# Altium footprint library Standard.PcbLib: 158 footprints (part 5 of 10)
Each footprint in its own frame and in the unit in brackets; x right, y up, seen from the top. Pads: shape width x height; smd on the part's side, far side on the other; paste and mask are expansions set on the pad; w line width, h text height; cw(c..) or ccw(c..) is an arc to the next point about the centre after c.
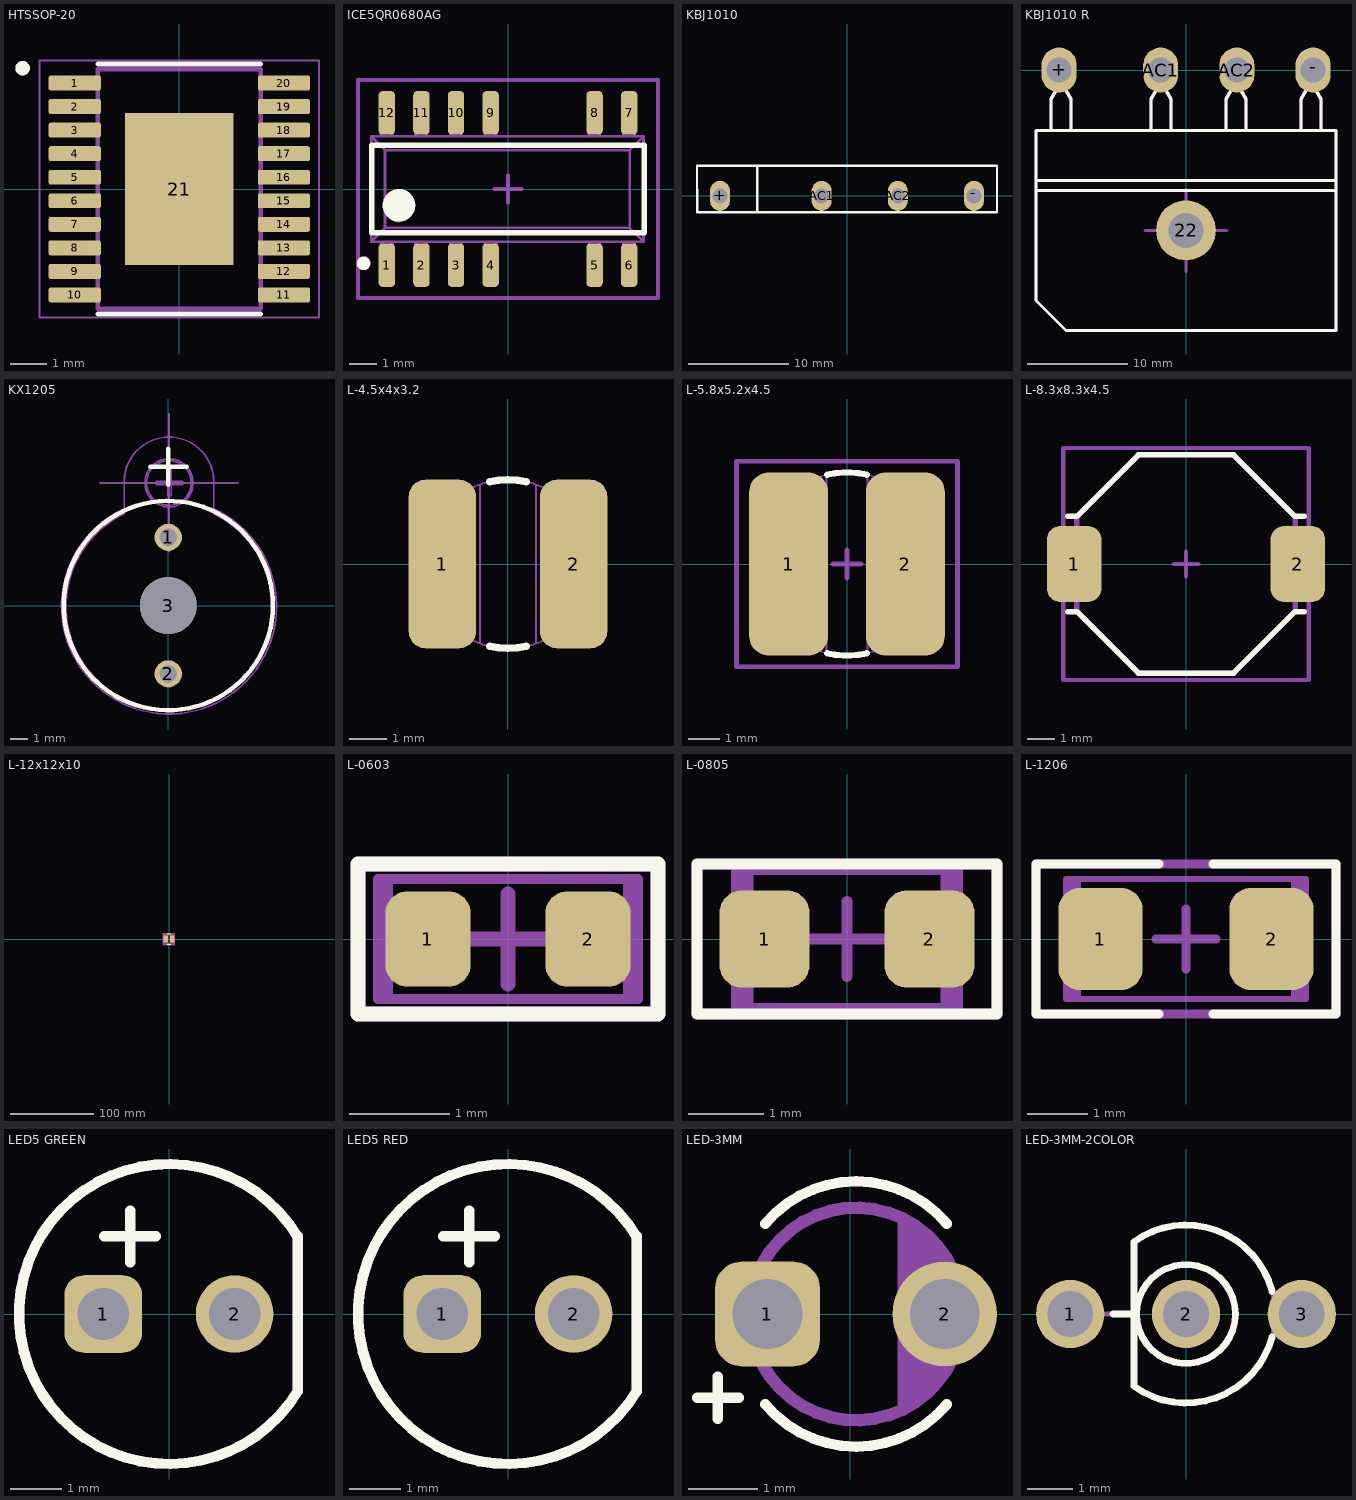
[diagram p4: the footprints below, top view; thin cyan lines are the x and y axes]

## HTSSOP-20 [mm]
pads (21):
  rrect25% 1.44x0.41 smd: 1(-2.885,2.925) 2(-2.885,2.275) 3(-2.885,1.625) 4(-2.885,0.975) 5(-2.885,0.325) 6(-2.885,-0.325) 7(-2.885,-0.975) 8(-2.885,-1.625) 9(-2.885,-2.275) 10(-2.885,-2.925) 11(2.885,-2.925) 12(2.885,-2.275) 13(2.885,-1.625) 14(2.885,-0.975) 15(2.885,-0.325) 16(2.885,0.325) 17(2.885,0.975) 18(2.885,1.625) 19(2.885,2.275) 20(2.885,2.925)
  rect 3x4.2 smd paste-3: 21(0,0)
Top Overlay:
  circle w0.2: c-4.325,3.335 r0.1
  lines w0.127: -2.25,-3.45 2.25,-3.45 ; -2.25,3.45 2.25,3.45
Top Paste:
  region: 0.75,-1.05 -0.75,-1.05 -0.75,1.05 0.75,1.05
Top Assembly:
  circle w0.2: c-4.325,3.335 r0.1
  lines w0.127: -2.25,-3.3 -2.25,3.3 2.25,3.3 2.25,-3.3 -2.25,-3.3
Top Component Outline:
  lines w0.05: -3.855,-3.55 -3.855,3.55 3.855,3.55 3.855,-3.55 -3.855,-3.55
3D body "LM5116MHX.STEP": height 1.1, standoff 0, extent -3.2,-3.25 3.2,3.25

## ICE5QR0680AG [mm] "SOIC, 12-Leads, ICE5QR0680AG"
height 1.75
pads (12):
  rrect50% 0.6x1.6 smd: 1(-4.458,-2.794) 2(-3.188,-2.794) 3(-1.918,-2.794) 4(-0.648,-2.794) 5(3.162,-2.794) 6(4.432,-2.794) 7(4.432,2.794) 8(3.162,2.794) 9(-0.648,2.794) 10(-1.918,2.794) 11(-3.188,2.794) 12(-4.458,2.794)
Top Overlay:
  circle w0.25: c-5.308,-2.725 r0.125
  circle w0.6: c-4.013,-0.6 r0.3
  lines w0.2: -5.013,-1.6 4.987,-1.6 4.987,1.6 -5.013,1.6 -5.013,-1.6
Top Assembly:
  drawing of 212 lines, arcs and shapes, not listed
Top Component Outline:
  lines w0.15: -0.513,0 0.487,0 ; -0.013,-0.5 -0.013,0.5 ; -5.513,-4 5.487,-4 5.487,4 -5.513,4 -5.513,-4
3D body "ICE5QR0680AG.STEP": height 1.7, standoff -0.05, extent -5.013,-2.9 4.987,2.9

## KBJ1010 [mm]
pads (4):
  oval 2x3 hole 1.5: +(-12.7,0) -(12.7,0) AC1(-2.54,0) AC2(5.08,0)
Top Overlay:
  lines w0.2: -9,-1.625 -9,3 ; -15,-1.625 15,-1.625 15,3 -15,3 -15,-1.625
  lines w0.25: -9,-1.625 -9,3 ; -15,-1.625 15,-1.625 15,3 -15,3 -15,-1.625
3D body "User Library-Silicon Bridge Rectifiers KBJ1010.step": height 23.85, standoff -13.35, extent -15,-1.8 15,3

## KBJ1010 R [mm]
pads (5):
  round 6 hole 3.5: 22(-0.009,-16.043)
  oval 3.5x4.5 hole 2.5: +(-12.7,0) -(12.7,0) AC1(-2.54,0) AC2(5.08,0)
Top Overlay:
  lines w0.3: -13.509,-6.043 -13.509,-2.909 -13.009,-2.043 -13.009,-0.343 ; -11.509,-6.043 -11.509,-2.909 -12.009,-2.043 -12.009,-0.343 ; -3.509,-6.043 -3.509,-2.909 -3.009,-2.043 -3.009,-0.343 ; -1.509,-6.043 -1.509,-2.909 -2.009,-2.043 -2.009,-0.343 ; 3.991,-6.043 3.991,-2.909 4.491,-2.043 4.491,-0.343 ; 5.991,-6.043 5.991,-2.909 5.491,-2.043 5.491,-0.343 ; 11.491,-6.043 11.491,-2.909 11.991,-2.043 11.991,-0.343 ; 13.491,-6.043 13.491,-2.909 12.991,-2.043 12.991,-0.343 ; -15.009,-12.043 14.991,-12.043 ; -15.009,-12.043 -15.009,-11.043 ; -15.009,-12.043 -15.009,-23.043 -12.009,-26.043 14.991,-26.043 14.991,-12.043 ; -15.009,-11.043 -15.009,-6.043 14.991,-6.043 14.991,-11.043 ; -15.009,-11.043 14.991,-11.043 ; -13.009,-0.343 -13.009,0.007 ; -13.009,-0.343 -12.009,-0.343 ; -13.009,0.007 -13.009,0.707 -12.609,0.707 ; -13.009,0.007 -12.609,0.007 ; -12.609,0.007 -12.609,0.707 ; -12.609,0.007 -12.409,0.007 ; -12.609,0.707 -12.409,0.707 ; -12.409,0.007 -12.409,0.707 ; -12.409,0.007 -12.009,0.007 ; -12.409,0.707 -12.009,0.707 -12.009,0.007 ; -12.009,-0.343 -12.009,0.007 ; -3.009,-0.343 -3.009,0.007 ; -3.009,-0.343 -2.009,-0.343 ; -3.009,0.007 -3.009,0.707 -2.609,0.707 ; -3.009,0.007 -2.609,0.007 ; -2.609,0.007 -2.609,0.707 ; -2.609,0.007 -2.409,0.007 ; -2.609,0.707 -2.409,0.707 ; -2.409,0.007 -2.409,0.707 ; -2.409,0.007 -2.009,0.007 ; -2.409,0.707 -2.009,0.707 -2.009,0.007 ; -2.009,-0.343 -2.009,0.007 ; 4.491,-0.343 4.491,0.007 ; 4.491,-0.343 5.491,-0.343 ; 4.491,0.007 4.491,0.707 4.891,0.707 ; 4.491,0.007 4.891,0.007 ; 4.891,0.007 4.891,0.707 ; 4.891,0.007 5.091,0.007 ; 4.891,0.707 5.091,0.707 ; 5.091,0.007 5.091,0.707 ; 5.091,0.007 5.491,0.007 ; 5.091,0.707 5.491,0.707 5.491,0.007 ; 5.491,-0.343 5.491,0.007 ; 11.991,-0.343 11.991,0.007 ; 11.991,-0.343 12.991,-0.343 ; 11.991,0.007 11.991,0.707 12.391,0.707 ; 11.991,0.007 12.391,0.007 ; 12.391,0.007 12.391,0.707 ; 12.391,0.007 12.591,0.007 ; 12.391,0.707 12.591,0.707 ; 12.591,0.007 12.591,0.707 ; 12.591,0.007 12.991,0.007 ; 12.591,0.707 12.991,0.707 12.991,0.007 ; 12.991,-0.343 12.991,0.007 ; 14.991,-12.043 14.991,-11.043
Top Assembly:
  circle w0.3: c-0.009,-16.043 r1.6
  lines w0.3: -13.509,-6.043 -13.509,-2.909 -13.009,-2.043 -13.009,-0.343 ; -11.509,-6.043 -11.509,-2.909 -12.009,-2.043 -12.009,-0.343 ; -4.109,-16.043 -2.509,-16.043 -0.009,-16.043 ; -3.509,-6.043 -3.509,-2.909 -3.009,-2.043 -3.009,-0.343 ; -1.509,-6.043 -1.509,-2.909 -2.009,-2.043 -2.009,-0.343 ; -0.009,-20.143 -0.009,-18.543 -0.009,-16.043 ; -0.009,-11.943 -0.009,-13.543 -0.009,-16.043 ; 3.991,-6.043 3.991,-2.909 4.491,-2.043 4.491,-0.343 ; 4.091,-16.043 2.491,-16.043 -0.009,-16.043 ; 5.991,-6.043 5.991,-2.909 5.491,-2.043 5.491,-0.343 ; 11.491,-6.043 11.491,-2.909 11.991,-2.043 11.991,-0.343 ; 13.491,-6.043 13.491,-2.909 12.991,-2.043 12.991,-0.343 ; -15.009,-12.043 -15.009,-23.043 -12.009,-26.043 14.991,-26.043 14.991,-12.043 ; -15.009,-12.043 -15.009,-11.043 ; -15.009,-12.043 14.991,-12.043 ; -15.009,-11.043 14.991,-11.043 ; -15.009,-11.043 -15.009,-6.043 14.991,-6.043 14.991,-11.043 ; -13.009,-0.343 -12.009,-0.343 ; -13.009,-0.343 -13.009,0.007 ; -13.009,0.007 -12.609,0.007 ; -13.009,0.007 -13.009,0.707 -12.609,0.707 ; -12.609,0.007 -12.409,0.007 ; -12.609,0.007 -12.609,0.707 ; -12.609,0.707 -12.409,0.707 ; -12.409,0.007 -12.009,0.007 ; -12.409,0.007 -12.409,0.707 ; -12.409,0.707 -12.009,0.707 -12.009,0.007 ; -12.009,-0.343 -12.009,0.007 ; -3.009,-0.343 -2.009,-0.343 ; -3.009,-0.343 -3.009,0.007 ; -3.009,0.007 -2.609,0.007 ; -3.009,0.007 -3.009,0.707 -2.609,0.707 ; -2.609,0.007 -2.409,0.007 ; -2.609,0.007 -2.609,0.707 ; -2.609,0.707 -2.409,0.707 ; -2.409,0.007 -2.009,0.007 ; -2.409,0.007 -2.409,0.707 ; -2.409,0.707 -2.009,0.707 -2.009,0.007 ; -2.009,-0.343 -2.009,0.007 ; 4.491,-0.343 5.491,-0.343 ; 4.491,-0.343 4.491,0.007 ; 4.491,0.007 4.891,0.007 ; 4.491,0.007 4.491,0.707 4.891,0.707 ; 4.891,0.007 5.091,0.007 ; 4.891,0.007 4.891,0.707 ; 4.891,0.707 5.091,0.707 ; 5.091,0.007 5.491,0.007 ; 5.091,0.007 5.091,0.707 ; 5.091,0.707 5.491,0.707 5.491,0.007 ; 5.491,-0.343 5.491,0.007 ; 11.991,-0.343 12.991,-0.343 ; 11.991,-0.343 11.991,0.007 ; 11.991,0.007 12.391,0.007 ; 11.991,0.007 11.991,0.707 12.391,0.707 ; 12.391,0.007 12.591,0.007 ; 12.391,0.007 12.391,0.707 ; 12.391,0.707 12.591,0.707 ; 12.591,0.007 12.991,0.007 ; 12.591,0.007 12.591,0.707 ; 12.591,0.707 12.991,0.707 12.991,0.007 ; 12.991,-0.343 12.991,0.007 ; 14.991,-12.043 14.991,-11.043
3D body "User Library-bridge-15A-V.step": height 10, standoff -4.15, extent -15,-26.5 15,0.25

## KX1205 [mil]
pads (3):
  round 60 hole 38: 1(0,150) 2(0,-150)
  round 125 hole 125 unplated: 3(0,0)
Top Overlay:
  circle w10: c0,0 r230
  lines w10: -40,305 40,305 ; 0,265 0,345
Top Assembly:
  circle w3.94: c1.57,269.56 r52.93
  circle w3.94: c1.57,269.56 r48.99
  lines w3.94: -149.78,269.56 -96.85,269.56 1.57,269.56 ; -96.85,212.77 ccw(c1.57,-1.97) 100,212.77 ; 1.57,118.2 1.57,171.13 1.57,269.56 ; 1.57,420.92 1.57,367.98 1.57,269.56 ; 152.93,269.56 100,269.56 1.57,269.56 ; -96.85,201.89 ccw(c1.57,-1.97) 100,201.89 100,271.82 ccw(c1.57,271.82) -96.85,271.82 -96.85,201.89 ; -25.68,265.78 -25.68,273.26 -1.1,273.26 -1.1,297.84 6.38,297.84 6.38,273.26 30.95,273.26 30.95,265.78 6.38,265.78 6.38,241.21 -1.1,241.21 -1.1,265.78 -25.68,265.78
3D body "ALSRobot-BUZZER.step": height 379.92, standoff -177.17, extent -236.22,-236.22 236.22,372.21

## L-4.5x4x3.2 [mm]
pads (2):
  rrect50% 1.8x4.5 smd: 1(-1.75,0) 2(1.75,0)
Top Overlay:
  lines w0.2: -0.488,-2.196 ccw(c0,0) 0.488,-2.196 ; -0.488,2.196 cw(c0,0) 0.488,2.196
Top Assembly:
  lines w0.05: -2.23,-0.301 ccw(c0,0) 2.229,-0.304 ; -2.229,0.304 cw(c0,0) 2.23,0.301 ; -2.225,-0.3 -1.946,-0.3 ; -2.225,0.3 -1.946,0.3 ; -1.981,-0.3 ccw(c-1.981,0) -1.981,0.3 ; -0.75,-2.108 -0.75,2.125 ; 0.75,-2.108 0.75,2.1 ; 1.946,-0.3 2.225,-0.3 ; 1.946,0.3 2.225,0.3 ; 1.981,-0.3 cw(c1.981,0) 1.981,0.3
3D body "User Library-Inductor SDR0403 Series.STEP": height 3.25, standoff 0, extent -2.201,-2.25 2.201,2.25

## L-5.8x5.2x4.5 [mm] "Дроссель SMD"
height 4.5
pads (2):
  rrect50% 2.5x5.8 smd: 1(-1.85,0) 2(1.85,0)
Top Overlay:
  lines w0.2: -0.629,-2.831 ccw(c0,0) 0.629,-2.831 ; -0.629,2.831 cw(c0,0) 0.629,2.831
Top Assembly:
  lines w0.05: -2.681,-0.3 ccw(c-2.681,0) -2.681,0.3 ; -2.646,-0.3 -2.786,-0.3 -2.874,-0.388 ccw(c0,0) 2.873,-0.392 ; -2.646,0.3 -2.777,0.3 -2.873,0.396 cw(c0,0) 2.874,0.388 2.778,0.291 2.647,0.291 ; -0.65,-2.825 -0.65,2.825 ; 0.65,-2.825 0.65,2.825 ; 2.647,-0.309 2.788,-0.309 2.875,-0.396 ; 2.682,-0.309 cw(c2.682,-0.009) 2.682,0.291
Top Component Outline:
  lines w0.15: -0.45,0 0.45,0 ; 0,-0.45 0,0.45 ; -3.5,-3.25 3.5,-3.25 3.5,3.25 -3.5,3.25 -3.5,-3.25
3D body "SMD_Inductor_CD54.step": height 4.49, standoff -0.01, extent -2.9,-2.6 2.9,2.6

## L-8.3x8.3x4.5 [mm] "Дроссель SMD"
height 4.5
pads (2):
  rrect50% 2x2.8 smd: 1(-4.1,0) 2(4.1,0)
Top Overlay:
  lines w0.2: -4.343,-1.75 -4,-1.75 -1.75,-4 1.75,-4 4,-1.75 4.342,-1.75 ; -4.342,1.75 -4,1.75 -1.75,4 1.75,4 4,1.75 4.343,1.75
Top Assembly:
  lines w0.2: -1.75,4 -4,1.75 -4,-1.75 -1.75,-4 1.75,-4 4,-1.75 4,1.75 1.75,4
Top Component Outline:
  lines w0.15: -0.45,0 0.45,0 ; 0,-0.45 0,0.45 ; -4.5,-4.25 -4.5,4.25 4.5,4.25 4.5,-4.25 -4.5,-4.25
3D body "User Library-drumCoreInductorSMT.STEP": height 4.5, standoff 0, extent -4.342,-4 4.343,4

## L-12x12x10 [mm]
pads (2):
  rect 5x9 smd: 1(-4,0) 2(4,0)
Top Layer:
  region: -6.5,4.6 -6.5,4.758 -6.439,5.067 -6.318,5.358 -6.143,5.62 -5.92,5.843 -5.658,6.018 -5.367,6.139 -5.058,6.2 -4.9,6.2 -2.5,6.2 -2.5,3.874 -6.5,3.874
  region: -6.5,-4.6 -6.5,-4.758 -6.439,-5.067 -6.318,-5.358 -6.143,-5.62 -5.92,-5.843 -5.658,-6.018 -5.367,-6.139 -5.058,-6.2 -4.9,-6.2 -2.5,-6.2 -2.5,-3.874 -6.5,-3.874
  region: 6.5,-4.6 6.5,-4.758 6.439,-5.067 6.318,-5.358 6.143,-5.62 5.92,-5.843 5.658,-6.018 5.367,-6.139 5.058,-6.2 4.9,-6.2 2.5,-6.2 2.5,-3.969 6.5,-3.969
  region: 6.5,4.6 6.5,4.758 6.439,5.067 6.318,5.358 6.143,5.62 5.92,5.843 5.658,6.018 5.367,6.139 5.058,6.2 4.9,6.2 2.5,6.2 2.5,3.874 6.5,3.874
Top Overlay:
  lines w0.2: -2.046,-6.15 -2.046,-6.15 2.046,-6.15 ; -2.046,6.15 2.046,6.15
Top Solder:
  region: -6.6,-4.6 -6.602,-4.762 -6.545,-5.081 -6.428,-5.382 -6.256,-5.656 -6.034,-5.892 -5.771,-6.081 -5.476,-6.216 -5.162,-6.293 -5,-6.3 -2.4,-6.3 -2.4,-4.5 -6.6,-4.5
  region: -6.6,4.6 -6.602,4.762 -6.545,5.081 -6.428,5.382 -6.256,5.656 -6.034,5.892 -5.771,6.081 -5.476,6.216 -5.162,6.293 -5,6.3 -2.4,6.3 -2.4,4.5 -6.6,4.5
  region: 6.6,4.6 6.602,4.762 6.545,5.081 6.428,5.383 6.256,5.656 6.034,5.892 5.771,6.081 5.476,6.216 5.162,6.293 5,6.3 2.4,6.3 2.4,4.5 6.6,4.5
  region: 6.6,-4.6 6.602,-4.762 6.545,-5.081 6.428,-5.383 6.256,-5.656 6.034,-5.892 5.771,-6.081 5.476,-6.216 5.162,-6.293 5,-6.3 2.4,-6.3 2.4,-4.5 6.6,-4.5
Top Assembly:
  circle w0.05: c0,0 r5.25
  circle w0.05: c-2.828,2.828 r0.25
  circle w0.05: c0,0 r5
  lines w0.05: -4.58,-3.045 -4.359,-2.926 ; -4.58,3.045 -4.359,2.926 ; -4.049,-3.342 -4.581,-3.874 ccw(c0,0) -3.874,-4.581 -3.342,-4.049 ; -4.049,3.342 -4.581,3.874 cw(c0,0) -3.874,4.581 -3.342,4.049 ; -3.045,-4.58 -2.926,-4.359 ; -3.045,4.58 -2.926,4.359 ; -2.165,-5.056 -2.046,-4.835 ; -2.165,5.056 -2.046,4.835 ; 2.046,-4.835 2.165,-5.056 ; 2.046,4.835 2.165,5.056 ; 2.926,-4.359 3.045,-4.58 ; 2.926,4.359 3.045,4.58 ; 3.342,-4.049 3.874,-4.581 ccw(c0,0) 4.581,-3.874 4.049,-3.342 ; 3.342,4.049 3.874,4.581 cw(c0,0) 4.581,3.874 4.049,3.342 ; 4.359,-2.926 4.58,-3.045 ; 4.359,2.926 4.58,3.045 ; -6.25,-4.25 ccw(c-4.25,-4.25) -4.25,-6.25 ; -6.25,-4.25 -6.15,-4.25 ; -6.25,-4.25 -6.25,4.25 ; -6.25,4.25 cw(c-4.25,4.25) -4.25,6.25 ; -6.25,4.25 -6.15,4.25 ; -6.15,-4.25 ccw(c-4.25,-4.25) -4.25,-6.15 ; -6.15,-4.25 -6.15,4.25 ; -6.15,4.25 cw(c-4.25,4.25) -4.25,6.15 ; -4.809,-2.966 cw(c0,0) -4.809,2.966 ; -4.809,-2.966 ccw(c-4.25,-4.25) -2.966,-4.809 ; -4.809,-2.966 cw(c-7.071,-5.196) -4.699,-3.083 ; -4.809,-2.966 cw(c11.081,-87.461) -4.65,-2.937 ; -4.809,2.966 ccw(c11.081,87.461) -4.65,2.937 ; -4.809,2.966 ccw(c-7.056,5.182) -4.699,3.083 ; -4.809,2.966 cw(c-4.25,4.25) -2.966,4.809 ; -4.699,-3.083 ccw(c-4.25,-4.25) -3.083,-4.699 ; -4.699,-3.083 ccw(c-4.735,-2.99) -4.65,-2.937 ; -4.699,-3.083 -4.581,-3.044 -4.65,-2.937 ; -4.699,3.083 cw(c-4.735,2.99) -4.65,2.937 ; -4.699,3.083 cw(c-4.25,4.25) -3.083,4.699 ; -4.699,3.083 -4.581,3.044 -4.65,2.937 ; -4.65,-2.937 cw(c0,0) -4.65,2.937 ; -4.25,-6.25 -4.25,-6.15 ; -4.25,-6.25 4.25,-6.25 ; -4.25,-6.15 4.25,-6.15 ; -4.25,6.15 4.25,6.15 ; -4.25,6.15 -4.25,6.25 ; -4.25,6.25 4.25,6.25 ; -3.083,-4.699 cw(c-5.196,-7.071) -2.966,-4.809 ; -3.083,-4.699 cw(c-2.99,-4.735) -2.937,-4.65 ; -3.083,-4.699 -3.044,-4.581 -2.937,-4.65 ; -3.083,4.699 ccw(c-5.182,7.056) -2.966,4.809 ; -3.083,4.699 ccw(c-2.99,4.735) -2.937,4.65 ; -3.083,4.699 -3.044,4.581 -2.937,4.65 ; -2.966,-4.809 ccw(c0,0) 2.966,-4.809 ; -2.966,-4.809 ccw(c-91.284,11.797) -2.937,-4.65 ; -2.966,4.809 cw(c0,0) 2.966,4.809 ; -2.966,4.809 cw(c-87.461,-11.081) -2.937,4.65 ; -2.937,-4.65 ccw(c0,0) 2.937,-4.65 ; -2.937,4.65 cw(c0,0) 2.937,4.65 ; 2.937,-4.65 ccw(c91.284,11.797) 2.966,-4.809 ; 2.937,-4.65 cw(c2.99,-4.735) 3.083,-4.699 ; 2.937,-4.65 3.044,-4.581 3.083,-4.699 ; 2.937,4.65 cw(c87.461,-11.081) 2.966,4.809 ; 2.937,4.65 ccw(c2.99,4.735) 3.083,4.699 ; 2.937,4.65 3.044,4.581 3.083,4.699 ; 2.966,-4.809 cw(c5.196,-7.071) 3.083,-4.699 ; 2.966,-4.809 ccw(c4.25,-4.25) 4.809,-2.966 ; 2.966,4.809 ccw(c5.182,7.056) 3.083,4.699 ; 2.966,4.809 cw(c4.25,4.25) 4.809,2.966 ; 3.083,-4.699 ccw(c4.25,-4.25) 4.699,-3.083 ; 3.083,4.699 cw(c4.25,4.25) 4.699,3.083 ; 4.25,-6.25 ccw(c4.25,-4.25) 6.25,-4.25 ; 4.25,-6.25 4.25,-6.15 ; 4.25,-6.15 ccw(c4.25,-4.25) 6.15,-4.25 ; 4.25,6.15 cw(c4.25,4.25) 6.15,4.25 ; 4.25,6.15 4.25,6.25 ; 4.25,6.25 cw(c4.25,4.25) 6.25,4.25 ; 4.65,-2.937 cw(c-11.797,-91.284) 4.809,-2.966 ; 4.65,-2.937 ccw(c0,0) 4.65,2.937 ; 4.65,-2.937 ccw(c4.735,-2.99) 4.699,-3.083 ; 4.65,-2.937 4.581,-3.044 4.699,-3.083 ; 4.65,2.937 ccw(c-11.797,91.284) 4.809,2.966 ; 4.65,2.937 cw(c4.735,2.99) 4.699,3.083 ; 4.65,2.937 4.581,3.044 4.699,3.083 ; 4.699,-3.083 cw(c7.071,-5.196) 4.809,-2.966 ; 4.699,3.083 ccw(c7.056,5.182) 4.809,2.966 ; 4.809,-2.966 ccw(c0,0) 4.809,2.966 ; 6.15,-4.25 6.25,-4.25 ; 6.15,-4.25 6.15,4.25 ; 6.15,4.25 6.25,4.25 ; 6.25,-4.25 6.25,4.25
Top Component Outline:
  lines w0.15: -0.45,0 0.45,0 ; 0,-0.45 0,0.45 ; -7,-6.75 7,-6.75 7,6.75 -7,6.75 -7,-6.75
3D body "User Library-SRR1210A.STEP": height 10, standoff 0, extent -6.004,-6 6.004,6

## L-0603 [mm]
height 0.6
pads (2):
  rrect50% 0.85x0.95 smd: 1(-0.8,0) 2(0.8,0)
Top Overlay:
  lines w0.15: -1.5,-0.75 -1.5,0.75 0,0.75 1.5,0.75 1.5,-0.75 0,-0.75 -1.5,-0.75
Top Assembly:
  lines w0.1: -1.2,-0.6 -1.2,0.6 ; 1.2,-0.6 1.2,0.6 ; -1.3,-0.6 -1.3,0.6 1.3,0.6 1.3,-0.6 -1.3,-0.6
Top Component Outline:
  lines w0.15: -0.45,0 0.45,0 ; 0,-0.45 0,0.45 ; -1.5,-0.75 -1.5,0.75 1.5,0.75 1.5,-0.75 -1.5,-0.75
3D body "INDC-0603 (1).stp": height 0.95, standoff 0, extent -0.875,-0.475 0.875,0.475

## L-0805 [mm] "hip Inductor, 2-Leads, Body 2,00x1,25mm, IPC Medium Density"
pads (2):
  rrect50% 1.2x1.3 smd: 1(-1.1,0) 2(1.1,0)
Top Overlay:
  lines w0.15: -2,-1 2,-1 2,1 -2,1 -2,-1
Top Assembly:
  rectangle: 1.3,-0.9 1.5,0.9
  rectangle: -1.5,-0.9 -1.3,0.9
  lines w0.1: -1.3,-0.9 -1.3,0.9 ; 1.3,-0.9 1.3,0.9 ; -1.5,-0.9 1.5,-0.9 1.5,0.9 -1.5,0.9 -1.5,-0.9
Top Component Outline:
  lines w0.15: -0.5,0 0.5,0 ; 0,-0.5 0,0.5 ; -2,-1 2,-1 2,1 -2,1 -2,-1
3D body "User Library-ind_0805.STEP": height 0.95, standoff 0, extent -1,-0.6 1,0.6

## L-1206 [mm] "Chip Inductor 2-Leads, Body 3,20x1,60mm, IPC Medium Density"
height 0.7
pads (2):
  rrect50% 1.4x1.7 smd: 1(-1.425,0) 2(1.425,0)
Top Overlay:
  lines w0.15: -0.45,-1.25 -2.5,-1.25 -2.5,1.25 -0.45,1.25 ; 0.45,-1.25 2.5,-1.25 2.5,1.25 0.45,1.25
Top Assembly:
  rectangle: -1.95,-1 -1.75,1
  rectangle: 1.75,-1 1.95,1
  lines w0.1: -2,-1 2,-1 2,1 -2,1 -2,-1
Top Component Outline:
  lines w0.15: -0.5,0 0.5,0 ; 0,-0.5 0,0.5 ; -2.5,-1.25 2.5,-1.25 2.5,1.25 -2.5,1.25 -2.5,-1.25
3D body "User Library-BLM31PG330SN1.STEP": height 1.11, standoff -0.01, extent -1.6,-0.81 1.6,0.81

## LED5 GREEN [mm] "Светодиод: выводной круглый, ф 5x8.6"
height 8.6
pads (2):
  rrect50% 1.5x1.5 hole 1: 1(-1.27,0)
  round 1.5 hole 1: 2(1.27,0)
Top Overlay:
  lines w0.2: -1.25,1.5 -0.25,1.5 ; -0.75,1 -0.75,2 ; 2.487,1.492 ccw(c0,0) 2.487,-1.492 ; 2.487,-1.492 2.487,1.5 2.487,-1.492
Top Assembly:
  lines w0.2: 2.487,1.492 ccw(c0,0) 2.487,-1.492 2.487,1.5
3D body "User Library-led5mm-green.STEP": height 9.6, standoff -1.8, extent -2.926,-2.949 2.525,2.948

## LED5 RED [mm] "Светодиод: выводной круглый, ф 5x8.6"
height 8.6
pads (2):
  rrect50% 1.5x1.5 hole 1: 1(-1.27,0)
  round 1.5 hole 1: 2(1.27,0)
Top Overlay:
  lines w0.2: -1.25,1.5 -0.25,1.5 ; -0.75,1 -0.75,2 ; 2.487,1.492 ccw(c0,0) 2.487,-1.492 2.487,1.5
Top Assembly:
  lines w0.2: 2.487,1.492 ccw(c0,0) 2.487,-1.492 2.487,1.5
3D body "User Library-led5mm-red.STEP": height 9.6, standoff -1.8, extent -2.926,-2.949 2.525,2.948

## LED-3MM [mm]
pads (2):
  rrect50% 1.5x1.5 hole 1: 1(-1.19,0)
  round 1.5 hole 1: 2(1.35,0)
Top Overlay:
  lines w0.15: -2.2,-1.2 -1.6,-1.2 ; -1.9,-1.5 -1.9,-0.9 ; -1.223,-1.293 ccw(c0.08,-0.2) 1.383,-1.293 ; -1.223,1.293 cw(c0.08,0.2) 1.383,1.293
Top Assembly:
  circle w0.178: c0.08,0 r1.524
  region: 0.68,1.4 0.68,-1.4 0.88,-1.3 1.08,-1.1 1.18,-1 1.48,-0.6 1.58,-0.3 1.58,0.2 1.48,0.5 1.38,0.7 1.28,0.9 1.08,1.1 0.88,1.3
3D body "User Library-Led round 3 mm Kingbright.step": height 29.6, standoff -2, extent -1.5,-1.6 1.7,1.6

## LED-3MM-2COLOR [mm]
pads (3):
  round 1.5 hole 1: 1(-2.54,0) 2(0,0) 3(2.54,0)
Top Overlay:
  circle w0.15: c0,0 r1.085
  lines w0.15: -1.6,0 -1.143,0 ; -1.144,-1.583 ccw(c0,0) 1.888,-0.5 ; -1.143,-1.583 -1.143,1.586 ; -1.14,1.586 cw(c0,0) 1.889,0.496
Top Assembly:
  circle w0.1: c0,0 r1.085
  lines w0.1: -2.286,0 -1.143,0 ; -1.143,-1.524 -1.143,1.524 ; -1.111,-1.606 ccw(c0,0) -1.111,1.606 ; 1.905,0 2.54,0
3D body "User Library-Lumex_SSL-LX3059IGW_BicolorLed.step": height 15, standoff -1.18, extent -2.794,-1.992 2.794,1.992